# Altium schematic symbol library AD_Lib.SchLib: 1239 symbols (part 2 of 9) (continued)
## IC_AD8397ARZ
designator IC?, comment AD8397
OPA; 2P; Io=0.31A; Manufacturer: ADI; Quality: -40~85¡æ; Value: ¡À1.5V~¡À12V;3V~24V;; pro-environment: RoHS; other: Io=310mA;SR=53V/us; OPN: AD8397ARZ; PadsNum: 0; SN: SN; Category: ¼¯³ÉÐ¾Æ¬; Part: AD8397; QTY: 98; Price: ?; OPN_JLC: OPN_JLC; SN_JLC: SN_JLC; Price_JLC: 0
footprint SO-8 (SOIC, 8-Leads, Body 4.9x3.9mm, Pitch 1.27mm, IPC Low Density)
part A pins: 1 OUTA (out), 2 INA- (in), 3 INA+ (in), 4 VEE (power), 8 VCC (power)
part B pins: 5 INB+ (in), 6 INB- (in), 7 OUTB (out)
part A text: Vcc; Vee

## IC_AD8629ARZ-REEL7
designator IC?, comment AD8629
OPA; 2P; Io=30mA; Manufacturer: ADI; Quality: -40~85¡æ; Value: 2.7V~6V;; pro-environment: RoHS; other: Io=30mA;SR=1V/us; OPN: AD8629ARZ-REEL7; PadsNum: 0; SN: SN; Category: ¼¯³ÉÐ¾Æ¬; Part: AD8629; QTY: 1000; Price: ?; OPN_JLC: OPN_JLC; SN_JLC: SN_JLC; Price_JLC: 0
footprint SO-8 (SOIC, 8-Leads, Body 4.9x3.9mm, Pitch 1.27mm, IPC Low Density)
part A pins: 1 OUTA (out), 2 INA- (in), 3 INA+ (in), 4 VEE (power), 8 VCC (power)
part B pins: 5 INB+ (in), 6 INB- (in), 7 OUTB (out)
part A text: Vcc; Vee

## IC_AD9832BRUZ
designator IC?, comment AD9832
²¨ÐÎ·¢ÉúÆ÷; SPI; 1CH; SPI; 10bit; Manufacturer: Analog Devices; Quality: -40~85¡æ; pro-environment: RoHS; other: SPI;10bit;2.97V~5.5V; OPN: AD9832BRUZ; PadsNum: 0; Value: SPI;10bit; SN: SN; Category: ¼¯³ÉÐ¾Æ¬; Part: AD9832; QTY: 96; Price: 67.9243; OPN_JLC: OPN_JLC; SN_JLC: SN_JLC; Price_JLC: 0
footprint TSSOP-16 (TSOP, 16-Leads, Body 5x4.4mm, Pitch 0.65mm, IPC Low Density)
pins: 1 FSADJ (in), 2 REFIN (in), 3 REFOUT (out), 4 DVDD (power), 5 DGND (power), 6 MCLK (in), 7 SCLK (in), 8 SDATA (in), 9 FSYNC (in), 10 FSEL (in), 11 PSEL1 (in), 12 PSEL0 (in), 13 AGND (power), 14 IOUT (out), 15 AVDD (power), 16 COMP
text: 10bit; DDS; ²¨; ÐÎ; ·¢; Éú; Æ÷

## IC_ADM2587EBRWZ
designator IC?, comment ADM2587E
RS485ÊÕ·¢Æ÷,È«Ë«¹¤,2.7~5.5V; Manufacturer: Analog Devices; Quality: -40~105¡æ; Value: 10 Mb/s; pro-environment: RoHS; SN: 03.4.11.20.84258701S; other: 2.7~5.5V,10 Mb/s; OPN: ADM2587EBRWZ; PadsNum: 0; Category: ¼¯³ÉÐ¾Æ¬; Part: ADM2587E; QTY: 47; Price: 75.7575; OPN_JLC: OPN_JLC; SN_JLC: SN_JLC; Price_JLC: 0
footprint SO-20_W (¿íÌåSO-20£¬ÈçADM2587)
pins: 1 GND1 (power), 2 VCC (power), 3 GND1, 4 RXD (out), 5 ~{RE} (in), 6 DE (in), 7 TXD (in), 8 VCC (power), 9 GND1 (power), 10 GND1 (power), 11 GND2 (power), 12 Visoout (power), 13 Y (io), 14 GND2 (power), 15 Z (io), 16 GND2 (power), 17 B (io), 18 A (io), 19 Visoin (power), 20 GND2 (power)

## IC_ADP3339AKCZ-3.3-R7
designator IC?, comment ADP3339AKCZ-3.3
ÎÈÑ¹Ð¾Æ¬; LDO; 3.3V/1.5A; 6V; Manufacturer: ADI; pro-environment: RoHS; Quality: -40~85¡æ; Value: 3.3V,1.5A; OPN: ADP3339AKCZ-3.3-R7; PadsNum: 4; SN: SN; Category: ¼¯³ÉÐ¾Æ¬; Part: ADP3339AKCZ-3.3; QTY: 2500; Price: -; OPN_JLC: AMS1117-3.3; SN_JLC: C347222; Price_JLC: 0.399434
footprint SOT223-4 (SOT223, 4-Leads, Body 6.5x3.5mm, Pitch 2.3mm, Lead Span 7mm, IPC Low Density)
pins: 1 GND, 2 Vout, 3 Vin, 4 Vout

## IC_ADP3339AKCZ-5-R7
designator IC?, comment ADP3339AKCZ-5
ÎÈÑ¹Ð¾Æ¬; LDO; Êä³öµçÁ÷5A; Manufacturer: ADI; pro-environment: RoHS; Quality: -40~85¡æ; Value: 6V,1.5A; OPN: ADP3339AKCZ-5-R7; PadsNum: 0; SN: SN; Category: ¼¯³ÉÐ¾Æ¬; Part: ADP3339AKCZ-5; QTY: 500; Price: ?; OPN_JLC: OPN_JLC; SN_JLC: SN_JLC; Price_JLC: 0
footprint SOT223-4 (SOT223, 4-Leads, Body 6.5x3.5mm, Pitch 2.3mm, Lead Span 7mm, IPC Low Density)
pins: 1 GND, 2 Vout, 3 Vin, 4 Vout

## IC_ADuM1200WTRZ
designator IC?, comment ADuM1200
Êý×Ö¸ôÀëÆ÷,2In,2.7~5.5V; Manufacturer: Analog Devices; Quality: -40~125¡æ; Value: 10 Mb/s; pro-environment: RoHS; other: 2.7~5.5V,10 Mb/s; OPN: ADuM1200WTRZ; PadsNum: 0; SN: SN; Category: ¼¯³ÉÐ¾Æ¬; Part: ADuM1200; QTY: 98; Price: 31.8591; OPN_JLC: OPN_JLC; SN_JLC: SN_JLC; Price_JLC: 0
footprint SO-8 (SOIC, 8-Leads, Body 4.9x3.9mm, Pitch 1.27mm, IPC Low Density)
pins: 1 VDD1 (power), 2 VIA (in), 3 VIB (in), 4 GND1, 5 GND2 (power), 6 VOB (out), 7 VOA (out), 8 VDD2 (power)

## IC_ADuM1410BRWZ
designator IC?, comment ADuM1410
Êý×Ö¸ôÀëÆ÷,4In,2.7~5.5V; Manufacturer: Analog Devices; Quality: -40~105¡æ; Value: 10 Mb/s; pro-environment: RoHS; SN: 03.4.11.20.47ADUM02S; other: 2.7~5.5V,10 Mb/s; OPN: ADuM1410BRWZ; PadsNum: 0; Category: ¼¯³ÉÐ¾Æ¬; Part: ADuM1410; QTY: 47; Price: 35.4159; OPN_JLC: OPN_JLC; SN_JLC: SN_JLC; Price_JLC: 0
footprint SO-16_W (¿íÌåSO-16£¬ÈçADuM1410BRWZ)
pins: 1 VDD1 (power), 2 GND1, 3 VIA (in), 4 VIB (in), 5 VIC (in), 6 VID (in), 7 DIS (in), 8 GND1, 9 GND2, 10 CTRL2 (in), 11 VOD (out), 12 VOC (out), 13 VOB (out), 14 VOA (out), 15 GND2 (power), 16 VDD2 (power)

## IC_ADuM1411BRWZ
designator IC?, comment ADuM1411
Êý×Ö¸ôÀëÆ÷,3In1Out,2.7~5.5V; Manufacturer: Analog Devices; Quality: -40~105¡æ; Value: 10 Mb/s; pro-environment: RoHS; SN: 03.4.11.20.47ADUM01S; other: 2.7~5.5V,10 Mb/s; OPN: ADuM1411BRWZ; PadsNum: 0; Category: ¼¯³ÉÐ¾Æ¬; Part: ADuM1411; QTY: 47; Price: 36.5391; OPN_JLC: OPN_JLC; SN_JLC: SN_JLC; Price_JLC: 0
footprint SO-16_W (¿íÌåSO-16£¬ÈçADuM1410BRWZ)
pins: 1 VDD1 (power), 2 GND1, 3 VIA (in), 4 VIB (in), 5 VIC (in), 6 VOD (out), 7 CTRL1 (in), 8 GND1, 9 GND2, 10 CTRL2 (in), 11 VID (in), 12 VOC (out), 13 VOB (out), 14 VOA (out), 15 GND2 (power), 16 VDD2 (power)

## IC_ADuM1412BRWZ
designator IC?, comment ADuM1412
Êý×Ö¸ôÀëÆ÷,2In2Out,2.7~5.5V; Manufacturer: Analog Devices; Quality: -40~105¡æ; Value: 10 Mb/s; pro-environment: RoHS; SN: 03.4.11.17.84141201S; other: 2.7~5.5V,10 Mb/s; OPN: ADuM1412BRWZ; PadsNum: 0; Category: ¼¯³ÉÐ¾Æ¬; Part: ADuM1412; QTY: 47; Price: 35.4159; OPN_JLC: OPN_JLC; SN_JLC: SN_JLC; Price_JLC: 0
footprint SO-16_W (¿íÌåSO-16£¬ÈçADuM1410BRWZ)
pins: 1 VDD1 (power), 2 GND1, 3 VIA (in), 4 VIB (in), 5 VIC (out), 6 VOD (out), 7 CTRL1 (in), 8 GND1, 9 GND2, 10 CTRL2 (in), 11 VID (in), 12 VOC (in), 13 VOB (out), 14 VOA (out), 15 GND2 (power), 16 VDD2 (power)

## IC_ADUM3200WBRZ
designator IC?, comment ADUM3200
Êý×Ö¸ôÀëÆ÷,2In,2.7~5.5V; Manufacturer: Analog Devices; Quality: -40~125¡æ; Value: 10 Mb/s; pro-environment: RoHS; other: 2.7~5.5V,10 Mb/s; OPN: ADUM3200WBRZ; PadsNum: 0; SN: SN; Category: ¼¯³ÉÐ¾Æ¬; Part: ADUM3200; QTY: 98; Price: 33.4503; OPN_JLC: OPN_JLC; SN_JLC: SN_JLC; Price_JLC: 0
footprint SO-8 (SOIC, 8-Leads, Body 4.9x3.9mm, Pitch 1.27mm, IPC Low Density)
pins: 1 VDD1 (power), 2 VIA (in), 3 VIB (in), 4 GND1, 5 GND2 (power), 6 VOB (out), 7 VOA (out), 8 VDD2 (power)

## IC_ADUM3201WBRZ
designator IC?, comment ADUM3201
Êý×Ö¸ôÀëÆ÷,1In1Out,2.7~5.5V; Manufacturer: Analog Devices; Quality: -40~125¡æ; Value: 10 Mb/s; pro-environment: RoHS; other: 2.7~5.5V,10 Mb/s; OPN: ADUM3201WBRZ; PadsNum: 0; SN: SN; Category: ¼¯³ÉÐ¾Æ¬; Part: ADUM3201; QTY: 98; Price: 33.4503; OPN_JLC: OPN_JLC; SN_JLC: SN_JLC; Price_JLC: 0
footprint SO-8 (SOIC, 8-Leads, Body 4.9x3.9mm, Pitch 1.27mm, IPC Low Density)
pins: 1 VDD1 (power), 2 VOA (out), 3 VIB (in), 4 GND1, 5 GND2 (power), 6 VOB (out), 7 VIA (in), 8 VDD2 (power)

## IC_AM26C31ID
designator IC?, comment AM26C31
RS422·¢ÉäÆ÷,4Í¨µÀ,4.5~5.5V; Manufacturer: TI; Quality: -40~125¡æ; Value: RS422,10Mb/s; pro-environment: RoHS; SN: 03.4.11.25.84263101S; OPN: AM26C31ID; PadsNum: 0; other: RS422·¢ÉäÆ÷,4Í¨µÀ,4.5~5.5V; Category: ¼¯³ÉÐ¾Æ¬; Part: AM26C31; QTY: 40; Price: 9.3834; OPN_JLC: OPN_JLC; SN_JLC: SN_JLC; Price_JLC: 0
footprint SO-16_N (SOIC, 16-Leads, Body 9.9x3.9mm, Pitch 1.27mm, IPC Medium Density)
pins: 1 1A (in), 2 1Y (out), 3 1Z (out), 4 G (in), 5 2Z (out), 6 2Y (out), 7 2A (in), 8 GND (power), 9 3A (in), 10 3Y (out), 11 3Z (out), 12 ~{G} (in), 13 4Z (out), 14 4Y (out), 15 4A (in), 16 VCC (power)
text: RS422·¢ÉäÆ÷£¬4Í¨µÀ

## IC_AM26C32ID
designator IC?, comment AM26C32
RS422½ÓÊÕÆ÷,4Í¨µÀ,4.5~5.5V; Manufacturer: TI; Quality: -40~125¡æ; Value: RS422,10Mb/s; pro-environment: RoHS; OPN: AM26C32ID; PadsNum: 0; SN: SN; other: RS422½ÓÊÕÆ÷,4Í¨µÀ,4.5~5.5V; Category: ¼¯³ÉÐ¾Æ¬; Part: AM26C32; QTY: 40; Price: 7.4997; OPN_JLC: OPN_JLC; SN_JLC: SN_JLC; Price_JLC: 0
footprint SO-16 (16-Pin Small Outline Package 1.27 mm Pitch, IPC Low Density)
pins: 1 1B (in), 2 1A (in), 3 1Y (out), 4 G (in), 5 2Y (out), 6 2A (in), 7 2B (in), 8 GND (power), 9 3B (in), 10 3A (in), 11 3Y (out), 12 ~{G} (in), 13 4Y (out), 14 4A (in), 15 4B (in), 16 VCC (power)
text: RS422½ÓÊÕÆ÷£¬4Í¨µÀ

## IC_AMS1117-3.3
designator IC?, comment AMS1117-3.3
ÎÈÑ¹Ð¾Æ¬; LDO; 3.3V/1A; 18V; Manufacturer: UMW; pro-environment: RoHS; Quality: -40~85¡æ; Value: 3.3V,1A; PadsNum: 4; SN: SN; Category: ¼¯³ÉÐ¾Æ¬; OPN: AMS1117-3.3; Part: AMS1117-3.3; QTY: 1000; Price: -; OPN_JLC: AMS1117-3.3; SN_JLC: C347256; Price_JLC: 0.35245
footprint SOT89-3 (TO-243AA, 3-Leads, Body 4.5x2.4 mm, Pitch 1.5mm, Lead Span 4.1mm, IPC Medium Density)
pins: 1 G, 2 Vo, 3 Vi

## IC_AP7332-3333W6-7
designator IC?, comment AP7332
ÎÈÑ¹Ð¾Æ¬; LDO; 2CH; 3.3V; 0.3A; Manufacturer: DIODE; Value: 3.3V,0.3A; Quality: -40~125¡æ; pro-environment: RoHS; OPN: AP7332-3333W6-7; PadsNum: 6; SN: SN; Category: ¼¯³ÉÐ¾Æ¬; Part: AP7332; QTY: 3000; Price: 1.0361; OPN_JLC: AP7332-3333W6-7; SN_JLC: C155362; Price_JLC: 1.0361
footprint SOT23-6 (SOT23, 6-Leads, Body 2.9x1.6mm, Pitch 0.95mm, Lead Span 2.7mm, IPC Low Density)
pins: 1 OUT2 (out), 2 GND (power), 3 EN2 (in), 4 EN1 (in), 5 IN (in), 6 OUT1 (out)

## IC_APX823-29W5G-7
designator IC?, comment APX823
µçÔ´¼àÊÓ;WDT;MR; Manufacturer: Diodes; Value: 2.96V,WDT,MR; Quality: -40~125¡æ; pro-environment: RoHS; OPN: APX823-29W5G-7; PadsNum: 0; other: µçÔ´¼àÊÓ; SN: SN; Category: ¼¯³ÉÐ¾Æ¬; Part: APX823; QTY: 3000; Price: 1.08112; OPN_JLC: OPN_JLC; SN_JLC: SN_JLC; Price_JLC: 0
footprint SOT23-5 (SOT23, 5-Leads, Body 2.9x1.6mm, Pitch 0.95mm, Lead Span 2.7mm, IPC Low Density)
pins: 1 ~{RST} (out), 2 GND (power), 3 ~{MR} (in), 4 WDI (in), 5 VDD (power)

## IC_AT45DB641E-SHN2B-T
designator IC?, comment AT45DB641E
NOR Flash,64Mb; Manufacturer: Adesto; pro-environment: RoHS; Quality: -40~85¡æ; SN: 03.4.11.16.84AT4501S; Value: 64Mb,3.3V; OPN: AT45DB641E-SHN2B-T; PadsNum: 0; Category: ¼¯³ÉÐ¾Æ¬; Part: AT45DB641E; QTY: 2000; Price: ?; OPN_JLC: OPN_JLC; SN_JLC: SN_JLC; Price_JLC: 0
footprint SO-8_W (8-Pin Small Outline Package 1.27 mm Pitch, IPC Low Density)
pins: 1 SI (in), 2 SCK (in), 3 ~{RST} (in), 4 ~{CS} (in), 5 ~{WP} (in), 6 VCC (power), 7 GND (power), 8 SO (out)
text: NOR; Flash; 64Mbit

## IC_AT93C46D-TH-B
designator IC?, comment AT93C46D
EEPROM,1Kb,1.8~5.5V,3-Wire; Manufacturer: Atmel; pro-environment: RoHS; Quality: -40~85¡æ; SN: 03.4.11.16.83AT9301S; OPN: AT93C46D-TH-B; PadsNum: 0; Value: 1Kb,1.8~5.5V; Category: ¼¯³ÉÐ¾Æ¬; Part: AT93C46D; QTY: 100; other: EEPROM,1Kb,1.8~5.5V,3-Wire; Price: 1.5327; OPN_JLC: OPN_JLC; SN_JLC: SN_JLC; Price_JLC: 0
footprint TSSOP-8
pins: 1 ~{CS} (in), 2 SK (in), 3 DI (in), 4 SO (out), 5 GND (power), 6 ORG, 7 NC, 8 VCC (power)
text: EEPROM; 1Kbit; 64 x 16

## IC_AT93C46EN-SH-B
designator IC?, comment AT93C46E
EEPROM,1Kb,1.8~5.5V,3-Wire; Manufacturer: Atmel; pro-environment: RoHS; Quality: -40~85¡æ; SN: 03.4.11.16.82934601S; OPN: AT93C46EN-SH-B; PadsNum: 0; Value: 1Kb,1.8~5.5V; Category: ¼¯³ÉÐ¾Æ¬; Part: AT93C46E; QTY: 100; other: EEPROM,1Kb,1.8~5.5V,3-Wire; Price: ?; OPN_JLC: OPN_JLC; SN_JLC: SN_JLC; Price_JLC: 0
footprint SO-8 (SOIC, 8-Leads, Body 4.9x3.9mm, Pitch 1.27mm, IPC Low Density)
pins: 1 ~{CS} (in), 2 SK (in), 3 DI (in), 4 SO (out), 5 GND (power), 6 NC, 7 NC, 8 VCC (power)
text: EEPROM; 1Kbit; 64 x 16

## IC_AT25040AN-10SU-2.7
designator IC?, comment AT25040
EEPROM,4Kb,2.7~5.5V,SPI; Manufacturer: Microchip; pro-environment: RoHS; Quality: -40~85¡æ; SN: 03.4.11.16.84250401S; OPN: AT25040AN-10SU-2.7; other: EEPROM,4Kb,512x8,2.7~5.5V,SPI; PadsNum: 0; Value: 4Kb,2.7~5.5V; Category: ¼¯³ÉÐ¾Æ¬; Part: AT25040; QTY: 100; Price: ?; OPN_JLC: OPN_JLC; SN_JLC: SN_JLC; Price_JLC: 0
footprint SO-8 (SOIC, 8-Leads, Body 4.9x3.9mm, Pitch 1.27mm, IPC Low Density)
pins: 1 ~{CS} (in), 2 SO (out), 3 ~{WP}, 4 GND (power), 5 SI (in), 6 SCK (in), 7 ~{HOLD}, 8 VCC (power)
text: EEPROM; 4Kbit; 512 x 8

## IC_BTS452RATMA1
designator IC?, comment BTS452R
IPS; HS; 1CH; 1.8A; 6~52V; Manufacturer: Infineon; pro-environment: RoHS; Quality: -40~150¡æ; Value: 1.8A,6~52V; OPN: BTS452RATMA1; PadsNum: 5; SN: SN; Category: ¼¯³ÉÐ¾Æ¬; Part: BTS452R; QTY: 2500; Price: 14.8934; OPN_JLC: BTS452RATMA1; SN_JLC: C126924; Price_JLC: 9.52
footprint TO252-5 (Footprint not found)
pins: 1 GND (power) "Logic ground", 2 IN (in) "Input", 4 ST (oc) "Diagnostic Feedback", 5 OUT (out) "Output to the Load", 6 VBB (power) "Positive Power Supply Voltage"
text: ¸ß; ²à; Çý; ¶¯

## IC_BTS50085-1TMA
designator IC?, comment BTS50085
IPS,HS,1CH,44A,5~58V; Manufacturer: Infineon; pro-environment: RoHS; Quality: -40~150¡æ; SN: 03.4.11.11.31508501S; OPN: BTS50085-1TMA; PadsNum: 0; Value: 44A,5~58V; Category: ¼¯³ÉÐ¾Æ¬; Part: BTS50085; QTY: 1000; Price: ?; OPN_JLC: OPN_JLC; SN_JLC: SN_JLC; Price_JLC: 0
footprint TO220-7 (TO,1.27mm pitch;7 pin,13.85mm L X 9.25mm W X 4.50mm H body)
pins: 1 OUT1 (out) "Output", 2 OUT2 (out) "Output", 3 IN (in) "Input", 4 VBB (power) "Supply Voltage", 5 IS (out) "Sense Output", 6 OUT3 (out) "Output", 7 OUT4 (out) "Output", 8 VBB (power) "Supply Voltage"
text: ¸ß; ²à; Çý; ¶¯

## IC_CASR 6-NP
designator IC?, comment CASR 6-NP
µçÁ÷´«¸ÐÆ÷; 0-100A; 5V; Manufacturer: LEM; Quality: -40~125¡æ; Value: 100A,5V; pro-environment: RoHS; other: 200mV/A; PadsNum: 0; SN: SN; Category: ¼¯³ÉÐ¾Æ¬; OPN: CASR 6-NP; Part: CASR 6-NP; QTY: 75; Price: ?; OPN_JLC: OPN_JLC; SN_JLC: SN_JLC; Price_JLC: 0
footprint SO-8 (SOIC, 8-Leads, Body 4.9x3.9mm, Pitch 1.27mm, IPC Low Density)
pins: 1 IN1 (in), 2 IN2 (in), 3 IN3 (in), 8 OUT3 (out), 9 OUT2 (out), 10 OUT1 (out), 11 Vref (power), 12 Vo (power), 13 GND (power), 14 VCC (power)
text: HallType

## IC_CD74HC4051PWR
designator IC?, comment CD74HC4051
Ä£Äâ¿ª¹Ø; 2.0V~6.0V; 1x 1:8;; Manufacturer: TI; pro-environment: RoHS; Quality: -55~125¡æ; OPN: CD74HC4051PWR; PadsNum: 16; SN: SN; Value: 2.0V~6.0V; Category: ¼¯³ÉÐ¾Æ¬; Part: CD74HC4051; QTY: 2000; Price: 2.7685; OPN_JLC: CD74HC4051PWR; SN_JLC: C352826; Price_JLC: 2.2516
footprint TSSOP-16 (TSOP, 16-Leads, Body 5x4.4mm, Pitch 0.65mm, IPC Low Density)
pins: 1 CH4 (io), 2 CH6 (io), 3 COM (io), 4 CH7 (io), 5 CH5 (io), 6 INH (in), 7 VEE (power), 8 GND (power), 9 C (in), 10 B (in), 11 A (in), 12 CH3 (io), 13 CH0 (io), 14 CH1 (io), 15 CH2 (io), 16 VDD (power)
text: Analogy SW; 3 -> 8

## IC_CD74HC4052PWR
designator IC?, comment CD74HC4051
Ä£Äâ¿ª¹Ø; 2.0V~6.0V; 4x 2:2;; Manufacturer: TI; pro-environment: RoHS; Quality: -55~125¡æ; OPN: CD74HC4051PWR; PadsNum: 16; SN: SN; Value: 2.0V~6.0V; Category: ¼¯³ÉÐ¾Æ¬; Part: CD74HC4051; QTY: 2000; Price: 0.8427; OPN_JLC: CD74HC4051PWR; SN_JLC: C402158; Price_JLC: 0.8427
footprint TSSOP-16 (TSOP, 16-Leads, Body 5x4.4mm, Pitch 0.65mm, IPC Low Density)
pins: 1 Y0 (io), 2 Y2 (io), 3 Y (io), 4 Y3 (io), 5 Y1 (io), 6 INH (in), 7 VEE (power), 8 GND (power), 9 B (in), 10 A (in), 11 X3 (in), 12 X0 (io), 13 X (io), 14 X1 (io), 15 X2 (io), 16 VDD (power)
text: Analogy SW; 3 -> 8

## IC_CD74HCT4040M
designator IC?, comment CD74HCT4040
¼ÆÊýÆ÷;12bit;5V; Manufacturer: TI; pro-environment: RoHS; Quality: -55~125¡æ; SN: 03.4.11.18.82404001S; Value: 12bit,4.5~5.5V; OPN: CD74HCT4040M; PadsNum: 0; Category: ¼¯³ÉÐ¾Æ¬; Part: CD74HCT4040; QTY: 40; Price: 4.8087; OPN_JLC: OPN_JLC; SN_JLC: SN_JLC; Price_JLC: 0
footprint SO-16_N (SOIC, 16-Leads, Body 9.9x3.9mm, Pitch 1.27mm, IPC Medium Density)
pins: 1 Q12 (out), 2 Q6 (out), 3 Q5 (out), 4 Q7 (out), 5 Q4 (out), 6 Q3 (out), 7 Q2 (out), 8 GND (power), 9 Q1 (out), 10 CP (in), 11 MR (in), 12 Q9 (out), 13 Q8 (out), 14 Q10 (out), 15 Q11 (out), 16 VDD (power)

## IC_CH330N
designator IC?, comment CH330N
USB Bridge; 3.3/5V; 2Mbps; Manufacturer: ÄÏ¾©Çßºã; Quality: -20~70¡æ; Value: 3.3/5V, 2Mbps; pro-environment: RoHS; PadsNum: 8; SN: SN; other: 3.3/5V, 2Mbps; Category: ¼¯³ÉÐ¾Æ¬; OPN: CH330N; Part: CH330N; QTY: 100; Price: -; OPN_JLC: CH330N; SN_JLC: C108996; Price_JLC: 2.87
footprint SO-8 (SOIC, 8-Leads, Body 4.9x3.9mm, Pitch 1.27mm, IPC Low Density)
pins: 1 D+ (io), 2 D- (io), 3 GND (power), 4 ~{RTS} (power), 5 V5 (power), 6 TXD (out), 7 RXD (in), 8 V33 (power)
text: USB<-->TTL

## IC_CJ78L05
designator IC?, comment 78L05
LDO; 5V/0.1A; 30V; Manufacturer: ½­ËÕ³¤µç; pro-environment: RoHS; Quality: -40~125¡æ; Value: 5V,0.1A; PadsNum: 3; SN: SN; Category: ¼¯³ÉÐ¾Æ¬; OPN: -; Part: 78L05; QTY: 1000; Price: -; OPN_JLC: CJ78L05; SN_JLC: C2079; Price_JLC: 0.453301
footprint SOT89-3 (TO-243AA, 3-Leads, Body 4.5x2.4 mm, Pitch 1.5mm, Lead Span 4.1mm, IPC Medium Density)
pins: 0 GND (power), 1 Vout, 2 GND (power), 3 Vin

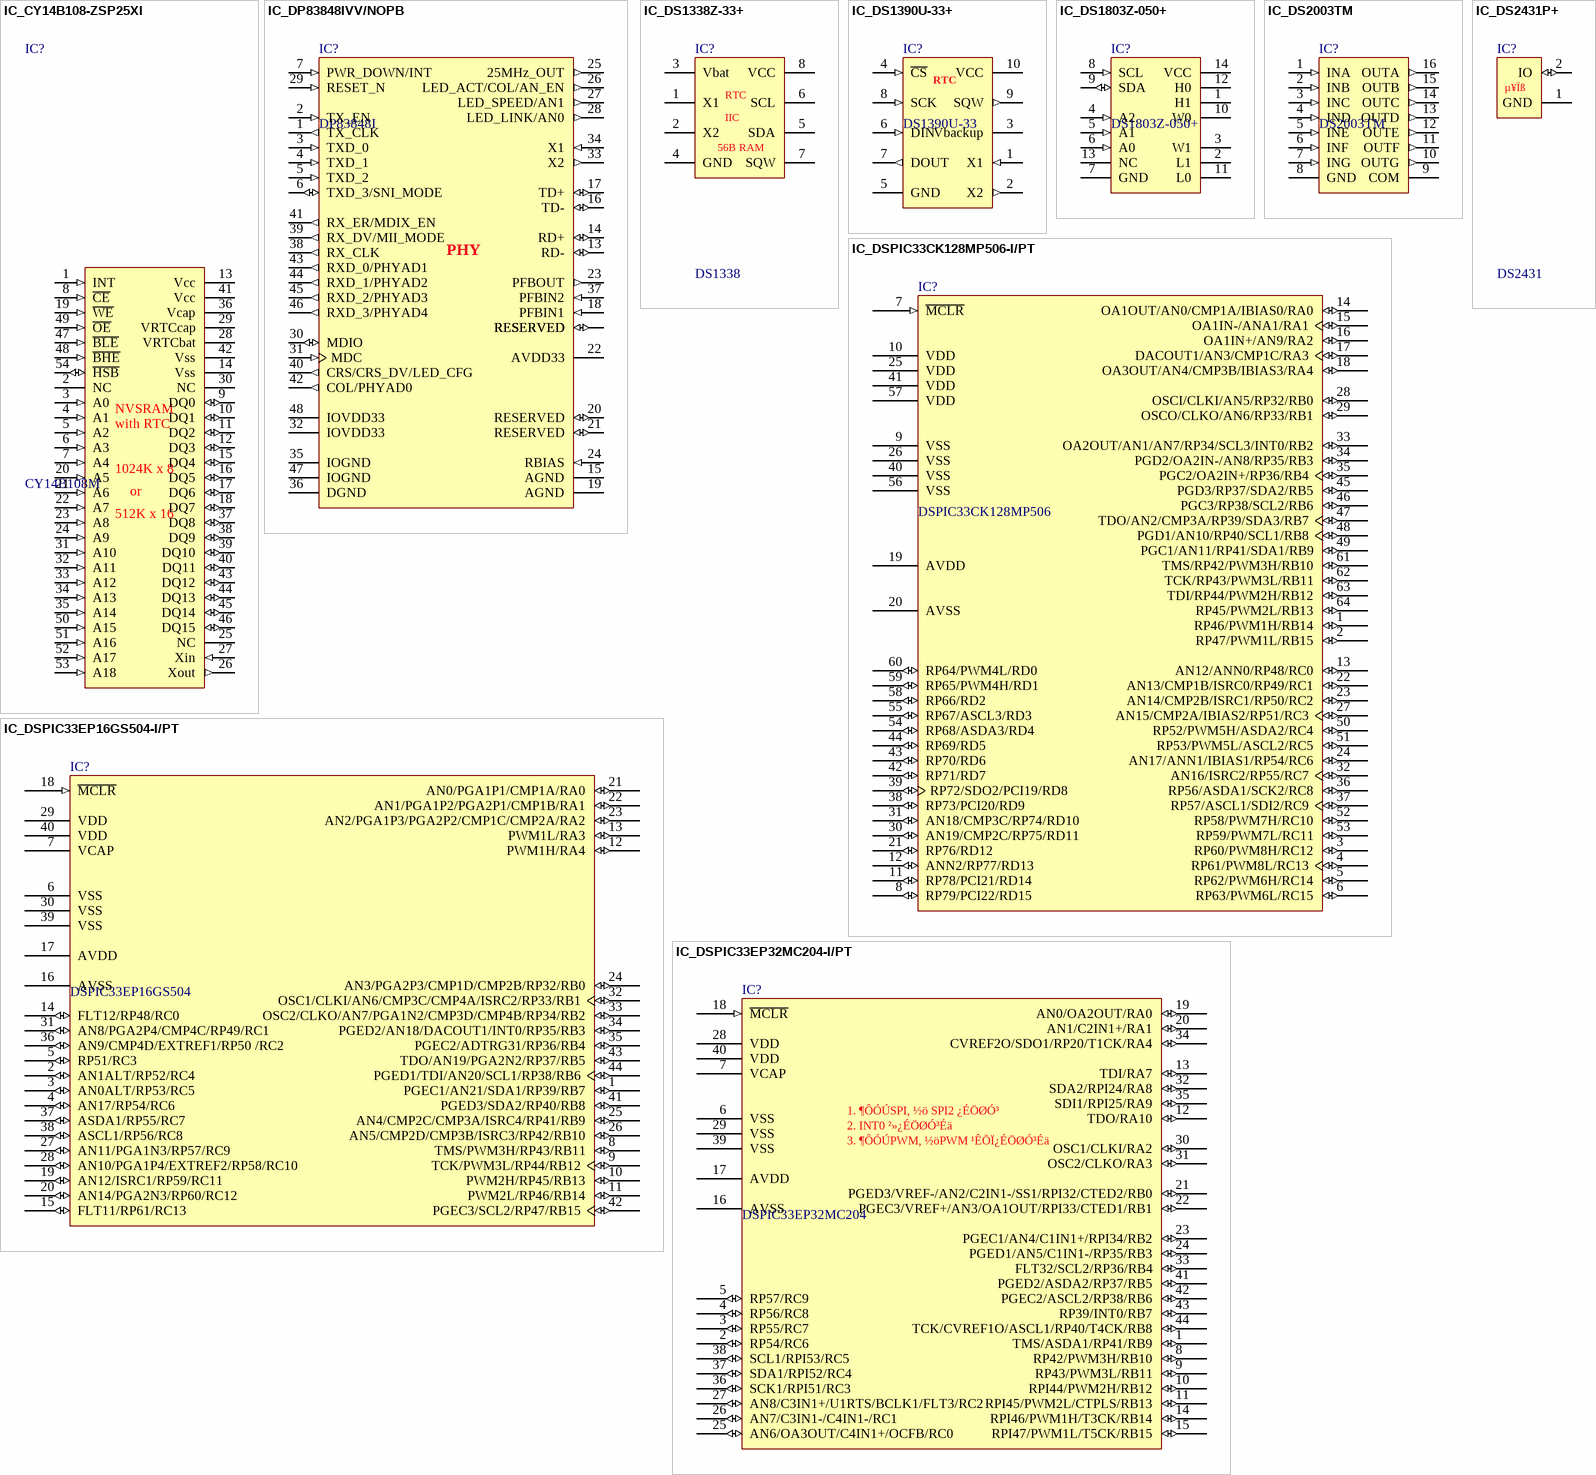
[diagram p8: symbols IC_CY14B108-ZSP25XI to IC_DSPIC33EP32MC204-I/PT]

## IC_CY14B108-ZSP25XI
designator IC?, comment CY14B108M
NVSRAM with clock; Manufacturer: CYPRESS; Quality: -40¡æ~85¡æ; SN: 03.4.11.16.77108M01S; Value: 512K*16,3.3V; pre-environment: RoHS; OPN: CY14B108M-ZSP25X; PadsNum: 0; Other: NVSRAM with clock; part: CY14B108M; Price: ?; OPN_JLC: OPN_JLC; SN_JLC: SN_JLC; Price_JLC: 0
footprint TSOP2-54 (SOP, 54-Leads, Body 22.2x10.16mm, Pitch 0.8mm, IPC Low Density)
pins: 1 INT (in), 2 NC, 3 A0 (in), 4 A1 (in), 5 A2 (in), 6 A3 (in), 7 A4 (in), 8 ~{CE} (in), 9 DQ0 (io), 10 DQ1 (io), 11 DQ2 (io), 12 DQ3 (io), 13 Vcc (power), 14 Vss (power), 15 DQ4 (io), 16 DQ5 (io), 17 DQ6 (io), 18 DQ7 (io), 19 ~{WE} (in), 20 A5 (in), 21 A6 (in), 22 A7 (in), 23 A8 (in), 24 A9 (in), 25 NC, 26 Xout (out), 27 Xin (in), 28 VRTCbat (power), 29 VRTCcap (power), 30 NC, 31 A10 (in), 32 A11 (in), 33 A12 (in), 34 A13 (in), 35 A14 (in), 36 Vcap (power), 37 DQ8 (io), 38 DQ9 (io), 39 DQ10 (io), 40 DQ11 (io), 41 Vcc (power), 42 Vss (power), 43 DQ12 (io), 44 DQ13 (io), 45 DQ14 (io), 46 DQ15 (io), 47 ~{BLE} (in), 48 ~{BHE} (in), 49 ~{OE} (in), 50 A15 (in), 51 A16 (in), 52 A17 (in), 53 A18 (in), 54 ~{HSB} (io)
text: NVSRAM; with RTC; 1024K x 8; or; 512K x 16

## IC_DP83848IVV/NOPB
designator IC?, comment DP83848I
ÒÔÌ«Íø PHY; Manufacturer: TI; pro-environment: RoHS; Quality: -40~85¡æ; SN: 03.4.11.25.68838402S; Value: 3.3V,10/100 Mb/s; OPN: DP83848IVV/NOPB; PadsNum: 0; Category: ¼¯³ÉÐ¾Æ¬; Part: DP83848I; QTY: 250; Price: ?; OPN_JLC: OPN_JLC; SN_JLC: SN_JLC; Price_JLC: 0
footprint LQFP-48 (48-Pin Thin Quad Flat Pack 0.5 mm Pitch, IPC Low Density)
pins: 1 TX_CLK (out), 2 TX_EN (in), 3 TXD_0 (in), 4 TXD_1 (in), 5 TXD_2 (in), 6 TXD_3/SNI_MODE (io), 7 PWR_DOWN/INT (in), 8 RESERVED (io), 9 RESERVED (io), 10 RESERVED (io), 11 RESERVED (io), 12 RESERVED (io), 13 RD- (io), 14 RD+ (io), 15 AGND (power), 16 TD- (io), 17 TD+ (io), 18 PFBIN1 (in), 19 AGND (power), 20 RESERVED (io), 21 RESERVED (io), 22 AVDD33 (power), 23 PFBOUT (out), 24 RBIAS (in), 25 25MHz_OUT (out), 26 LED_ACT/COL/AN_EN (out), 27 LED_SPEED/AN1 (out), 28 LED_LINK/AN0 (out), 29 RESET_N (in), 30 MDIO (io), 31 MDC (in), 32 IOVDD33 (power), 33 X2 (out), 34 X1 (in), 35 IOGND (power), 36 DGND (power), 37 PFBIN2 (in), 38 RX_CLK (out), 39 RX_DV/MII_MODE (out), 40 CRS/CRS_DV/LED_CFG (out), 41 RX_ER/MDIX_EN (out), 42 COL/PHYAD0 (out), 43 RXD_0/PHYAD1 (out), 44 RXD_1/PHYAD2 (out), 45 RXD_2/PHYAD3 (out), 46 RXD_3/PHYAD4 (out), 47 IOGND (power), 48 IOVDD33 (power)
text: PHY

## IC_DS1338Z-33+
designator IC?, comment DS1338
RTC;56B RAM;3.0~5.5V;IIC; Manufacturer: Maxim; pro-environment: RoHS; Quality: -40~85¡æ; OPN: DS1338Z-33+; other: RTC,56B RAM,3.0~5.5V,IIC; PadsNum: 0; SN: SN; Value: 3.0~5.5V; Category: ¼¯³ÉÐ¾Æ¬; Part: DS1338; QTY: 100; Price: 20.241; OPN_JLC: OPN_JLC; SN_JLC: SN_JLC; Price_JLC: 0
footprint SO-8 (SOIC, 8-Leads, Body 4.9x3.9mm, Pitch 1.27mm, IPC Low Density)
pins: 1 X1, 2 X2, 3 Vbat (power), 4 GND (power), 5 SDA (oc), 6 SCL (oc), 7 SQW (oc), 8 VCC (power)
text: RTC; IIC; 56B RAM

## IC_DS1390U-33+
designator IC?, comment DS1390U-33
RTC,SPI,2.97~5.5V; Manufacturer: Maxim; pro-environment: RoHS; Quality: -40~85¡æ; SN: 03.4.11.14.75139001S; Value: 2.97~5.5V;2mA; OPN: DS1390U-33+; other: SPI;2.97~5.5V;2mA; PadsNum: 0; Category: ¼¯³ÉÐ¾Æ¬; Part: DS1390U-33; QTY: 50; Price: 22.6395; OPN_JLC: OPN_JLC; SN_JLC: SN_JLC; Price_JLC: 0
footprint MSOP-10 (Body Width 3 mm; Pitch 0.5 mm;(uMAX-10&RM-10))
pins: 1 X1 (in), 2 X2 (out), 3 Vbackup (power), 4 ~{CS} (in), 5 GND (power), 6 DIN (in), 7 DOUT (out), 8 SCK (in), 9 SQW (out), 10 VCC (power)
text: RTC

## IC_DS1803Z-050+
designator IC?, comment DS1803Z-050+
Êý×ÖµçÎ»Æ÷,IIC,50k¦¸,2.7V~5.5V; Manufacturer: Maxim; pro-environment: RoHS; Quality: -40~85¡æ; other: IIC£¬50k£¬256·Ö½ÓÍ·; PadsNum: 0; SN: SN; Value: 50k¦¸,2.7V~5.5V; Category: ¼¯³ÉÐ¾Æ¬; OPN: DS1803Z-050+; Part: DS1803Z-050+; QTY: 50; Price: 26.5122; OPN_JLC: OPN_JLC; SN_JLC: SN_JLC; Price_JLC: 0
footprint TSSOP-14 (Shrink Small Outline; 14 Leads; Body Width 4.4 mm; Pitch 0.65 mm)
pins: 1 H1, 2 L1, 3 W1, 4 A2 (in), 5 A1 (in), 6 A0 (in), 7 GND (power), 8 SCL (in), 9 SDA (io), 10 W0, 11 L0, 12 H0, 13 NC, 14 VCC (power)

## IC_DS2003TM
designator IC?, comment DS2003TM
´ïÁÖ¶Ù¹Ü£¬7Í¨µÀ; Manufacturer: TI; pro-environment: RoHS; Quality: -40~125¡æ; SN: 03.4.11.20.47200301S; Value: 0.5A,50V; OPN: DS2003TM/NOPB; PadsNum: 0; Category: ¼¯³ÉÐ¾Æ¬; Part: DS2003TM; Price: ?; OPN_JLC: OPN_JLC; SN_JLC: SN_JLC; Price_JLC: 0
footprint SO-16 (16-Pin Small Outline Package 1.27 mm Pitch, IPC Low Density)
pins: 1 INA (in), 2 INB (in), 3 INC (in), 4 IND (in), 5 INE (in), 6 INF (in), 7 ING (in), 8 GND (power), 9 COM (power), 10 OUTG (out), 11 OUTF (out), 12 OUTE (out), 13 OUTD (out), 14 OUTC (out), 15 OUTB (out), 16 OUTA (out)

## IC_DS2431P+
designator IC?, comment DS2431
EEPROM,1Kb,2.8~5.25V,1-Wire; Manufacturer: Maxim; pro-environment: RoHS; Quality: -40~85¡æ; OPN: DS2431P+; PadsNum: 0; SN: SN; Value: 1Kb,2.8~5.25V; Category: ¼¯³ÉÐ¾Æ¬; Part: DS2431; QTY: 120; other: EEPROM,1Kb,2.8~5.25V,1-Wire; Price: 9.594; OPN_JLC: OPN_JLC; SN_JLC: SN_JLC; Price_JLC: 0
footprint TSOC-6
pins: 1 GND (power), 2 IO (io)
text: µ¥Ïß

## IC_DSPIC33CK128MP506-I/PT
designator IC?, comment DSPIC33CK128MP506
16bit MCU;60MHz;512 KB Flash, 52KB RAM; Manufacturer: Microchip; pro-environment: RoHS; Quality: -40~85¡æ; Value: 16bit MCU;100MHz;128 KB Flash, 16KB RAM; OPN: DSPIC33EP512MC806-I/PT; PadsNum: 0; SN: SN; Category: ¼¯³ÉÐ¾Æ¬; Part: DSPIC33CK128MP506; QTY: 160; Price: 26.6906; OPN_JLC: OPN_JLC; SN_JLC: SN_JLC; Price_JLC: 0
footprint TQFP-64 (Thin QFP, 64-Leads, Body 10x10mm, Pitch 0.5mm, IPC Low Density)
pins: 1 RP46/PWM1H/RB14 (io), 2 RP47/PWM1L/RB15 (io), 3 RP60/PWM8H/RC12 (io), 4 RP61/PWM8L/RC13 (io), 5 RP62/PWM6H/RC14 (io), 6 RP63/PWM6L/RC15 (io), 7 ~{MCLR} (in), 8 RP79/PCI22/RD15 (io), 9 VSS (power), 10 VDD (power), 11 RP78/PCI21/RD14 (io), 12 ANN2/RP77/RD13 (io), 13 AN12/ANN0/RP48/RC0 (io), 14 OA1OUT/AN0/CMP1A/IBIAS0/RA0 (io), 15 OA1IN-/ANA1/RA1 (io), 16 OA1IN+/AN9/RA2 (io), 17 DACOUT1/AN3/CMP1C/RA3 (io), 18 OA3OUT/AN4/CMP3B/IBIAS3/RA4 (io), 19 AVDD (power), 20 AVSS (power), 21 RP76/RD12 (io), 22 AN13/CMP1B/ISRC0/RP49/RC1 (io), 23 AN14/CMP2B/ISRC1/RP50/RC2 (io), 24 AN17/ANN1/IBIAS1/RP54/RC6 (io), 25 VDD (power), 26 VSS (power), 27 AN15/CMP2A/IBIAS2/RP51/RC3 (io), 28 OSCI/CLKI/AN5/RP32/RB0 (io), 29 OSCO/CLKO/AN6/RP33/RB1 (io), 30 AN19/CMP2C/RP75/RD11 (io), 31 AN18/CMP3C/RP74/RD10 (io), 32 AN16/ISRC2/RP55/RC7 (io), 33 OA2OUT/AN1/AN7/RP34/SCL3/INT0/RB2 (io), 34 PGD2/OA2IN-/AN8/RP35/RB3 (io), 35 PGC2/OA2IN+/RP36/RB4 (io), 36 RP56/ASDA1/SCK2/RC8 (io), 37 RP57/ASCL1/SDI2/RC9 (io), 38 RP73/PCI20/RD9 (io), 39 RP72/SDO2/PCI19/RD8 (io), 40 VSS (power), 41 VDD (power), 42 RP71/RD7 (io), 43 RP70/RD6 (io), 44 RP69/RD5 (io), 45 PGD3/RP37/SDA2/RB5 (io), 46 PGC3/RP38/SCL2/RB6 (io), 47 TDO/AN2/CMP3A/RP39/SDA3/RB7 (io), 48 PGD1/AN10/RP40/SCL1/RB8 (io), 49 PGC1/AN11/RP41/SDA1/RB9 (io), 50 RP52/PWM5H/ASDA2/RC4 (io), 51 RP53/PWM5L/ASCL2/RC5 (io), 52 RP58/PWM7H/RC10 (io), 53 RP59/PWM7L/RC11 (io), 54 RP68/ASDA3/RD4 (io), 55 RP67/ASCL3/RD3 (io), 56 VSS (power), 57 VDD (power), 58 RP66/RD2 (io), 59 RP65/PWM4H/RD1 (io), 60 RP64/PWM4L/RD0 (io), 61 TMS/RP42/PWM3H/RB10 (io), 62 TCK/RP43/PWM3L/RB11 (io), 63 TDI/RP44/PWM2H/RB12 (io), 64 RP45/PWM2L/RB13 (io)

## IC_DSPIC33EP16GS504-I/PT
designator IC?, comment DSPIC33EP16GS504
MCU;16bit; 40MHz; 16KB Flash; 2KB RAM; Manufacturer: Microchip; pro-environment: RoHS; Quality: -40~85¡æ; Value: 16bit MCU;40MHz;16KB Flash, 2KB RAM; OPN: DSPIC33EP16GS504-I/PT; PadsNum: 0; SN: SN; Category: ¼¯³ÉÐ¾Æ¬; Part: DSPIC33EP16GS504; QTY: 160; Price: 20.8728; OPN_JLC: OPN_JLC; SN_JLC: SN_JLC; Price_JLC: 0
footprint TQFP-44 (Thin QFP, 44-Leads, Body 10x10mm, Pitch 0.8mm, IPC Low Density)
pins: 1 PGEC1/AN21/SDA1/RP39/RB7 (io), 2 AN1ALT/RP52/RC4 (io), 3 AN0ALT/RP53/RC5 (io), 4 AN17/RP54/RC6 (io), 5 RP51/RC3 (io), 6 VSS (power), 7 VCAP (power), 8 TMS/PWM3H/RP43/RB11 (io), 9 TCK/PWM3L/RP44/RB12 (io), 10 PWM2H/RP45/RB13 (io), 11 PWM2L/RP46/RB14 (io), 12 PWM1H/RA4 (io), 13 PWM1L/RA3 (io), 14 FLT12/RP48/RC0 (io), 15 FLT11/RP61/RC13 (io), 16 AVSS (power), 17 AVDD (power), 18 ~{MCLR} (in), 19 AN12/ISRC1/RP59/RC11 (io), 20 AN14/PGA2N3/RP60/RC12 (io), 21 AN0/PGA1P1/CMP1A/RA0 (io), 22 AN1/PGA1P2/PGA2P1/CMP1B/RA1 (io), 23 AN2/PGA1P3/PGA2P2/CMP1C/CMP2A/RA2 (io), 24 AN3/PGA2P3/CMP1D/CMP2B/RP32/RB0 (io), 25 AN4/CMP2C/CMP3A/ISRC4/RP41/RB9 (io), 26 AN5/CMP2D/CMP3B/ISRC3/RP42/RB10 (io), 27 AN11/PGA1N3/RP57/RC9 (io), 28 AN10/PGA1P4/EXTREF2/RP58/RC10 (io), 29 VDD (power), 30 VSS (power), 31 AN8/PGA2P4/CMP4C/RP49/RC1 (io), 32 OSC1/CLKI/AN6/CMP3C/CMP4A/ISRC2/RP33/RB1 (io), 33 OSC2/CLKO/AN7/PGA1N2/CMP3D/CMP4B/RP34/RB2 (io), 34 PGED2/AN18/DACOUT1/INT0/RP35/RB3 (io), 35 PGEC2/ADTRG31/RP36/RB4 (io), 36 AN9/CMP4D/EXTREF1/RP50 /RC2 (io), 37 ASDA1/RP55/RC7 (io), 38 ASCL1/RP56/RC8 (io), 39 VSS (power), 40 VDD (power), 41 PGED3/SDA2/RP40/RB8 (io), 42 PGEC3/SCL2/RP47/RB15 (io), 43 TDO/AN19/PGA2N2/RP37/RB5 (io), 44 PGED1/TDI/AN20/SCL1/RP38/RB6 (io)

## IC_DSPIC33EP32MC204-I/PT
designator IC?, comment DSPIC33EP32MC204
16bit MCU;60MHz;32KB Flash, 4KB RAM; Manufacturer: Microchip; pro-environment: RoHS; Quality: -40~85¡æ; OPN: DSPIC33EP32MC204-I/PT; PadsNum: 0; SN: SN; Value: 16bit MCU;60MHz;32KB Flash, 4KB RAM; Category: ¼¯³ÉÐ¾Æ¬; Part: DSPIC33EP32MC204; QTY: 160; Price: 14.7186; OPN_JLC: OPN_JLC; SN_JLC: SN_JLC; Price_JLC: 0
footprint TQFP-44 (Thin QFP, 44-Leads, Body 10x10mm, Pitch 0.8mm, IPC Low Density)
pins: 1 TMS/ASDA1/RP41/RB9 (io), 2 RP54/RC6 (io), 3 RP55/RC7 (io), 4 RP56/RC8 (io), 5 RP57/RC9 (io), 6 VSS (power), 7 VCAP (power), 8 RP42/PWM3H/RB10 (io), 9 RP43/PWM3L/RB11 (io), 10 RPI44/PWM2H/RB12 (io), 11 RPI45/PWM2L/CTPLS/RB13 (io), 12 TDO/RA10 (io), 13 TDI/RA7 (io), 14 RPI46/PWM1H/T3CK/RB14 (io), 15 RPI47/PWM1L/T5CK/RB15 (io), 16 AVSS (power), 17 AVDD (power), 18 ~{MCLR} (in), 19 AN0/OA2OUT/RA0 (io), 20 AN1/C2IN1+/RA1 (io), 21 PGED3/VREF-/AN2/C2IN1-/SS1/RPI32/CTED2/RB0 (io), 22 PGEC3/VREF+/AN3/OA1OUT/RPI33/CTED1/RB1 (io), 23 PGEC1/AN4/C1IN1+/RPI34/RB2 (io), 24 PGED1/AN5/C1IN1-/RP35/RB3 (io), 25 AN6/OA3OUT/C4IN1+/OCFB/RC0 (io), 26 AN7/C3IN1-/C4IN1-/RC1 (io), 27 AN8/C3IN1+/U1RTS/BCLK1/FLT3/RC2 (io), 28 VDD (power), 29 VSS (power), 30 OSC1/CLKI/RA2 (io), 31 OSC2/CLKO/RA3 (io), 32 SDA2/RPI24/RA8 (io), 33 FLT32/SCL2/RP36/RB4 (io), 34 CVREF2O/SDO1/RP20/T1CK/RA4 (io), 35 SDI1/RPI25/RA9 (io), 36 SCK1/RPI51/RC3 (io), 37 SDA1/RPI52/RC4 (io), 38 SCL1/RPI53/RC5 (io), 39 VSS (power), 40 VDD (power), 41 PGED2/ASDA2/RP37/RB5 (io), 42 PGEC2/ASCL2/RP38/RB6 (io), 43 RP39/INT0/RB7 (io), 44 TCK/CVREF1O/ASCL1/RP40/T4CK/RB8 (io)
text: 1. ¶ÔÓÚSPI, ½ö SPI2 ¿ÉÖØÓ³; 2. INT0 ²»¿ÉÖØÓ³Éä; 3. ¶ÔÓÚPWM, ½öPWM ¹ÊÕÏ¿ÉÖØÓ³Éä

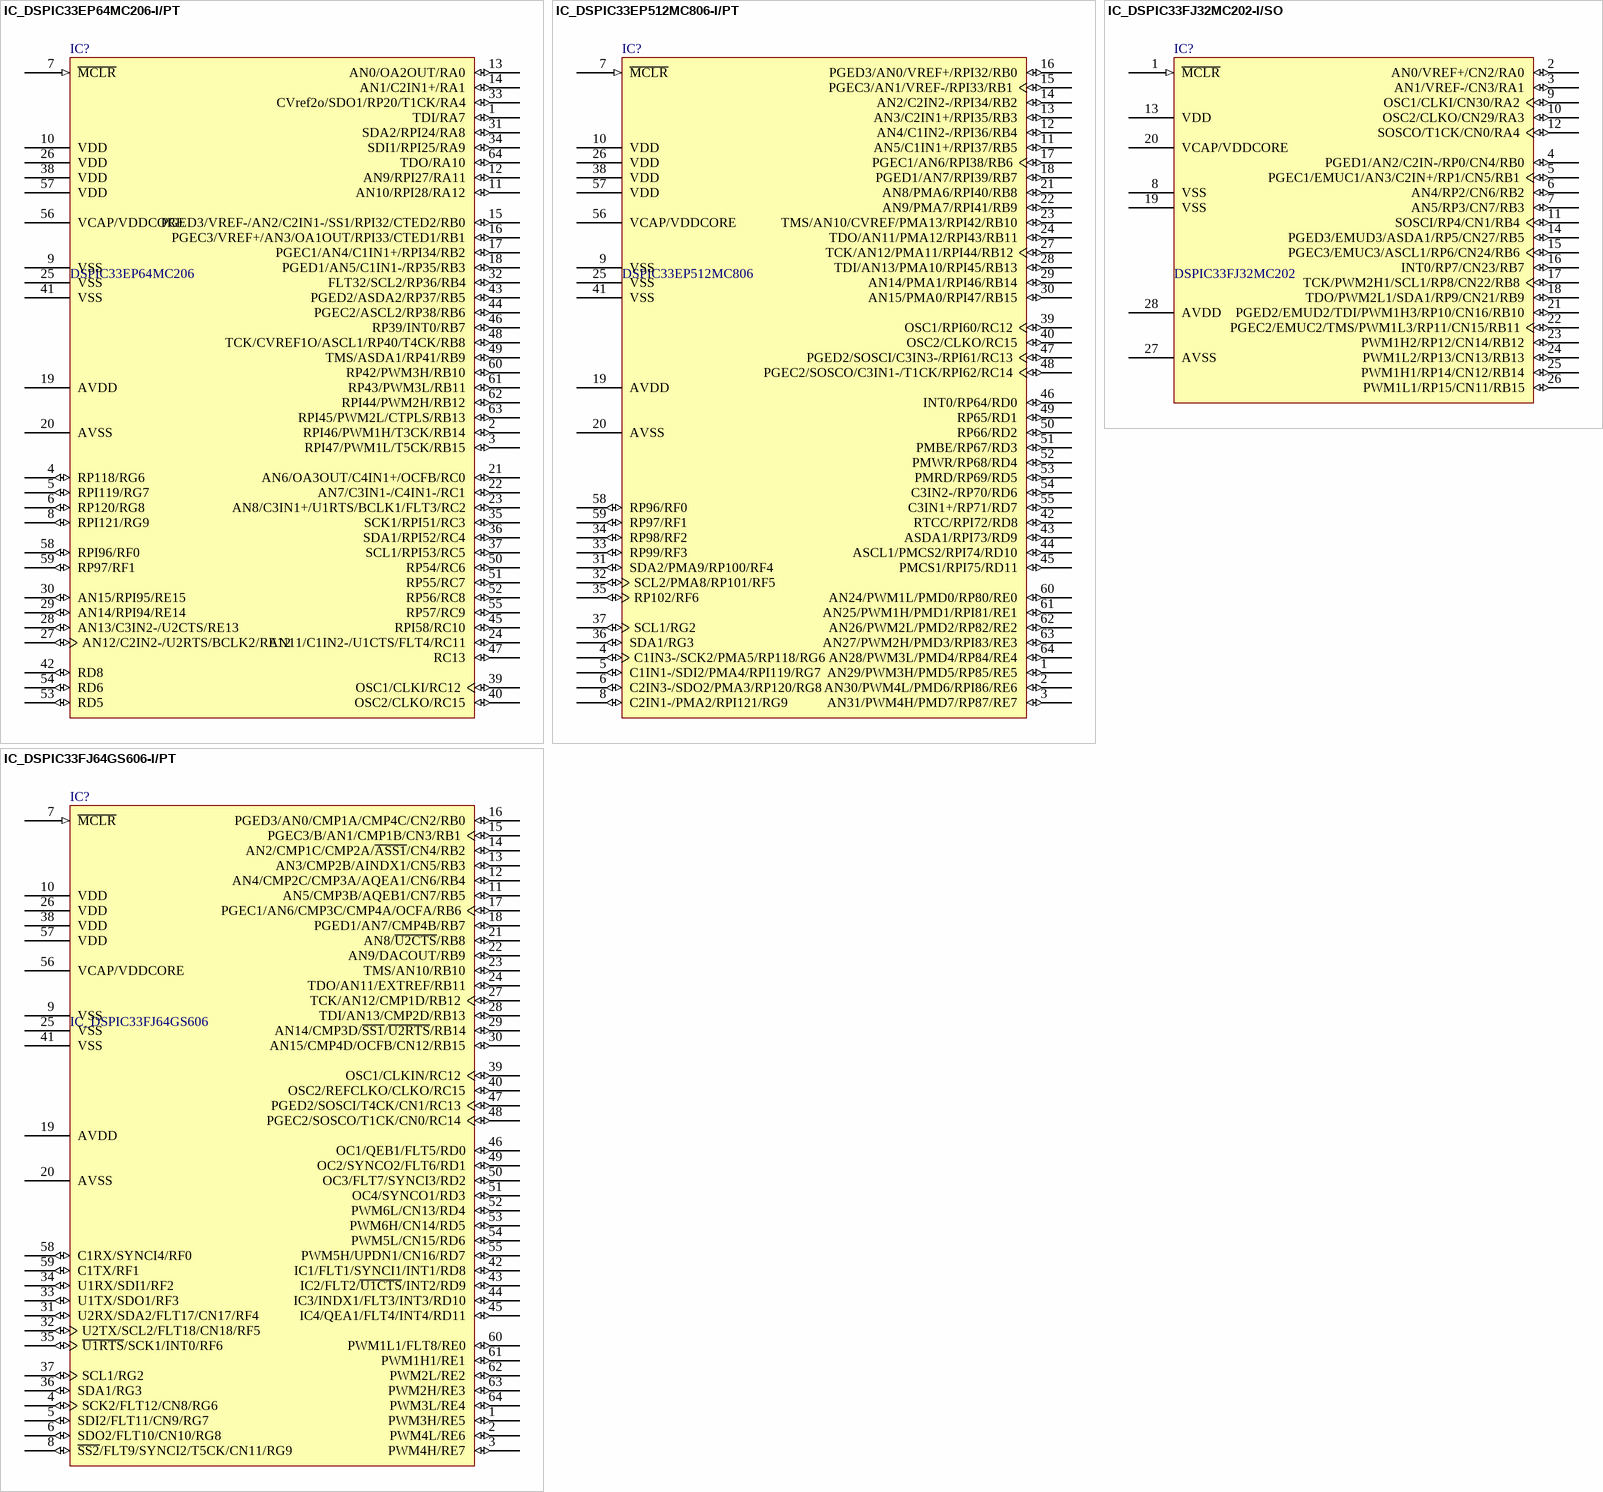
[diagram p9: symbols IC_DSPIC33EP64MC206-I/PT to IC_DSPIC33FJ64GS606-I/PT]

## IC_DSPIC33EP64MC206-I/PT
designator IC?, comment DSPIC33EP64MC206
16bit MCU;60MHz;64KB Flash, 8KB RAM; Manufacturer: Microchip; pro-environment: RoHS; Quality: -40~85¡æ; OPN: DSPIC33EP64MC206-I/PT; PadsNum: 0; SN: SN; Value: 16bit MCU;60MHz;64 KB Flash, 8KB RAM; Category: ¼¯³ÉÐ¾Æ¬; Part: DSPIC33EP64MC206; QTY: 160; Price: 19.1997; OPN_JLC: OPN_JLC; SN_JLC: SN_JLC; Price_JLC: 0
footprint TQFP-64 (Thin QFP, 64-Leads, Body 10x10mm, Pitch 0.5mm, IPC Low Density)
pins: 1 TDI/RA7 (io), 2 RPI46/PWM1H/T3CK/RB14 (io), 3 RPI47/PWM1L/T5CK/RB15 (io), 4 RP118/RG6 (io), 5 RPI119/RG7 (io), 6 RP120/RG8 (io), 7 ~{MCLR} (in), 8 RPI121/RG9 (io), 9 VSS (power), 10 VDD (power), 11 AN10/RPI28/RA12 (io), 12 AN9/RPI27/RA11 (io), 13 AN0/OA2OUT/RA0 (io), 14 AN1/C2IN1+/RA1 (io), 15 PGED3/VREF-/AN2/C2IN1-/SS1/RPI32/CTED2/RB0 (io), 16 PGEC3/VREF+/AN3/OA1OUT/RPI33/CTED1/RB1 (io), 17 PGEC1/AN4/C1IN1+/RPI34/RB2 (io), 18 PGED1/AN5/C1IN1-/RP35/RB3 (io), 19 AVDD (power), 20 AVSS (power), 21 AN6/OA3OUT/C4IN1+/OCFB/RC0 (io), 22 AN7/C3IN1-/C4IN1-/RC1 (io), 23 AN8/C3IN1+/U1RTS/BCLK1/FLT3/RC2 (io), 24 AN11/C1IN2-/U1CTS/FLT4/RC11 (io), 25 VSS (power), 26 VDD (power), 27 AN12/C2IN2-/U2RTS/BCLK2/RE12 (io), 28 AN13/C3IN2-/U2CTS/RE13 (io), 29 AN14/RPI94/RE14 (io), 30 AN15/RPI95/RE15 (io), 31 SDA2/RPI24/RA8 (io), 32 FLT32/SCL2/RP36/RB4 (io), 33 CVref2o/SDO1/RP20/T1CK/RA4 (io), 34 SDI1/RPI25/RA9 (io), 35 SCK1/RPI51/RC3 (io), 36 SDA1/RPI52/RC4 (io), 37 SCL1/RPI53/RC5 (io), 38 VDD (power), 39 OSC1/CLKI/RC12 (io), 40 OSC2/CLKO/RC15 (io), 41 VSS (power), 42 RD8 (io), 43 PGED2/ASDA2/RP37/RB5 (io), 44 PGEC2/ASCL2/RP38/RB6 (io), 45 RPI58/RC10 (io), 46 RP39/INT0/RB7 (io), 47 RC13 (io), 48 TCK/CVREF1O/ASCL1/RP40/T4CK/RB8 (io), 49 TMS/ASDA1/RP41/RB9 (io), 50 RP54/RC6 (io), 51 RP55/RC7 (io), 52 RP56/RC8 (io), 53 RD5 (io), 54 RD6 (io), 55 RP57/RC9 (io), 56 VCAP/VDDCORE (power), 57 VDD (power), 58 RPI96/RF0 (io), 59 RP97/RF1 (io), 60 RP42/PWM3H/RB10 (io), 61 RP43/PWM3L/RB11 (io), 62 RPI44/PWM2H/RB12 (io), 63 RPI45/PWM2L/CTPLS/RB13 (io), 64 TDO/RA10 (io)

## IC_DSPIC33EP512MC806-I/PT
designator IC?, comment DSPIC33EP512MC806
16bit MCU;60MHz;512 KB Flash, 52KB RAM; Manufacturer: Microchip; pro-environment: RoHS; Quality: -40~85¡æ; OPN: DSPIC33EP512MC806-I/PT; PadsNum: 0; SN: SN; Value: 16bit MCU;60MHz;512 KB Flash, 52KB RAM; Category: ¼¯³ÉÐ¾Æ¬; Part: DSPIC33EP512MC806; QTY: 160; Price: 49.8069; OPN_JLC: OPN_JLC; SN_JLC: SN_JLC; Price_JLC: 0
footprint TQFP-64 (Thin QFP, 64-Leads, Body 10x10mm, Pitch 0.5mm, IPC Low Density)
pins: 1 AN29/PWM3H/PMD5/RP85/RE5 (io), 2 AN30/PWM4L/PMD6/RPI86/RE6 (io), 3 AN31/PWM4H/PMD7/RP87/RE7 (io), 4 C1IN3-/SCK2/PMA5/RP118/RG6 (io), 5 C1IN1-/SDI2/PMA4/RPI119/RG7 (io), 6 C2IN3-/SDO2/PMA3/RP120/RG8 (io), 7 ~{MCLR} (in), 8 C2IN1-/PMA2/RPI121/RG9 (io), 9 VSS (power), 10 VDD (power), 11 AN5/C1IN1+/RPI37/RB5 (io), 12 AN4/C1IN2-/RPI36/RB4 (io), 13 AN3/C2IN1+/RPI35/RB3 (io), 14 AN2/C2IN2-/RPI34/RB2 (io), 15 PGEC3/AN1/VREF-/RPI33/RB1 (io), 16 PGED3/AN0/VREF+/RPI32/RB0 (io), 17 PGEC1/AN6/RPI38/RB6 (io), 18 PGED1/AN7/RPI39/RB7 (io), 19 AVDD (power), 20 AVSS (power), 21 AN8/PMA6/RPI40/RB8 (io), 22 AN9/PMA7/RPI41/RB9 (io), 23 TMS/AN10/CVREF/PMA13/RPI42/RB10 (io), 24 TDO/AN11/PMA12/RPI43/RB11 (io), 25 VSS (power), 26 VDD (power), 27 TCK/AN12/PMA11/RPI44/RB12 (io), 28 TDI/AN13/PMA10/RPI45/RB13 (io), 29 AN14/PMA1/RPI46/RB14 (io), 30 AN15/PMA0/RPI47/RB15 (io), 31 SDA2/PMA9/RP100/RF4 (io), 32 SCL2/PMA8/RP101/RF5 (io), 33 RP99/RF3 (io), 34 RP98/RF2 (io), 35 RP102/RF6 (io), 36 SDA1/RG3 (io), 37 SCL1/RG2 (io), 38 VDD (power), 39 OSC1/RPI60/RC12 (io), 40 OSC2/CLKO/RC15 (io), 41 VSS (power), 42 RTCC/RPI72/RD8 (io), 43 ASDA1/RPI73/RD9 (io), 44 ASCL1/PMCS2/RPI74/RD10 (io), 45 PMCS1/RPI75/RD11 (io), 46 INT0/RP64/RD0 (io), 47 PGED2/SOSCI/C3IN3-/RPI61/RC13 (io), 48 PGEC2/SOSCO/C3IN1-/T1CK/RPI62/RC14 (io), 49 RP65/RD1 (io), 50 RP66/RD2 (io), 51 PMBE/RP67/RD3 (io), 52 PMWR/RP68/RD4 (io), 53 PMRD/RP69/RD5 (io), 54 C3IN2-/RP70/RD6 (io), 55 C3IN1+/RP71/RD7 (io), 56 VCAP/VDDCORE (power), 57 VDD (power), 58 RP96/RF0 (io), 59 RP97/RF1 (io), 60 AN24/PWM1L/PMD0/RP80/RE0 (io), 61 AN25/PWM1H/PMD1/RPI81/RE1 (io), 62 AN26/PWM2L/PMD2/RP82/RE2 (io), 63 AN27/PWM2H/PMD3/RPI83/RE3 (io), 64 AN28/PWM3L/PMD4/RP84/RE4 (io)

## IC_DSPIC33FJ32MC202-I/SO
designator IC?, comment DSPIC33FJ32MC202
MCU; 16bit; 40MHz; 32 KB Flash; 2 KB RAM; Manufacturer: Microchip; pro-environment: RoHS; Quality: -40~85¡æ; Value: 16bit MCU;40MHz;32 KB Flash, 2 KB RAM; OPN: DSPIC33FJ32MC202-I/SO; PadsNum: 0; SN: SN; Category: ¼¯³ÉÐ¾Æ¬; Part: DSPIC33FJ32MC202; QTY: 47; Price: ?; OPN_JLC: OPN_JLC; SN_JLC: SN_JLC; Price_JLC: 0
footprint SO-28 (SOIC, 28-Leads, Body 17.9x7.5mm, Pitch 1.27mm, IPC Low Density)
pins: 1 ~{MCLR} (in), 2 AN0/VREF+/CN2/RA0 (io), 3 AN1/VREF-/CN3/RA1 (io), 4 PGED1/AN2/C2IN-/RP0/CN4/RB0 (io), 5 PGEC1/EMUC1/AN3/C2IN+/RP1/CN5/RB1 (io), 6 AN4/RP2/CN6/RB2 (io), 7 AN5/RP3/CN7/RB3 (io), 8 VSS (power), 9 OSC1/CLKI/CN30/RA2 (io), 10 OSC2/CLKO/CN29/RA3 (io), 11 SOSCI/RP4/CN1/RB4 (io), 12 SOSCO/T1CK/CN0/RA4 (io), 13 VDD (power), 14 PGED3/EMUD3/ASDA1/RP5/CN27/RB5 (io), 15 PGEC3/EMUC3/ASCL1/RP6/CN24/RB6 (io), 16 INT0/RP7/CN23/RB7 (io), 17 TCK/PWM2H1/SCL1/RP8/CN22/RB8 (io), 18 TDO/PWM2L1/SDA1/RP9/CN21/RB9 (io), 19 VSS (power), 20 VCAP/VDDCORE (power), 21 PGED2/EMUD2/TDI/PWM1H3/RP10/CN16/RB10 (io), 22 PGEC2/EMUC2/TMS/PWM1L3/RP11/CN15/RB11 (io), 23 PWM1H2/RP12/CN14/RB12 (io), 24 PWM1L2/RP13/CN13/RB13 (io), 25 PWM1H1/RP14/CN12/RB14 (io), 26 PWM1L1/RP15/CN11/RB15 (io), 27 AVSS (power), 28 AVDD (power)